# Altium footprint library lib_datalogger.PcbLib: 866 footprints (part 47 of 55)
Each footprint in its own frame and in the unit in brackets; x right, y up, seen from the top. Pads: shape width x height; smd on the part's side, far side on the other; paste and mask are expansions set on the pad; w line width, h text height; cw(c..) or ccw(c..) is an arc to the next point about the centre after c.
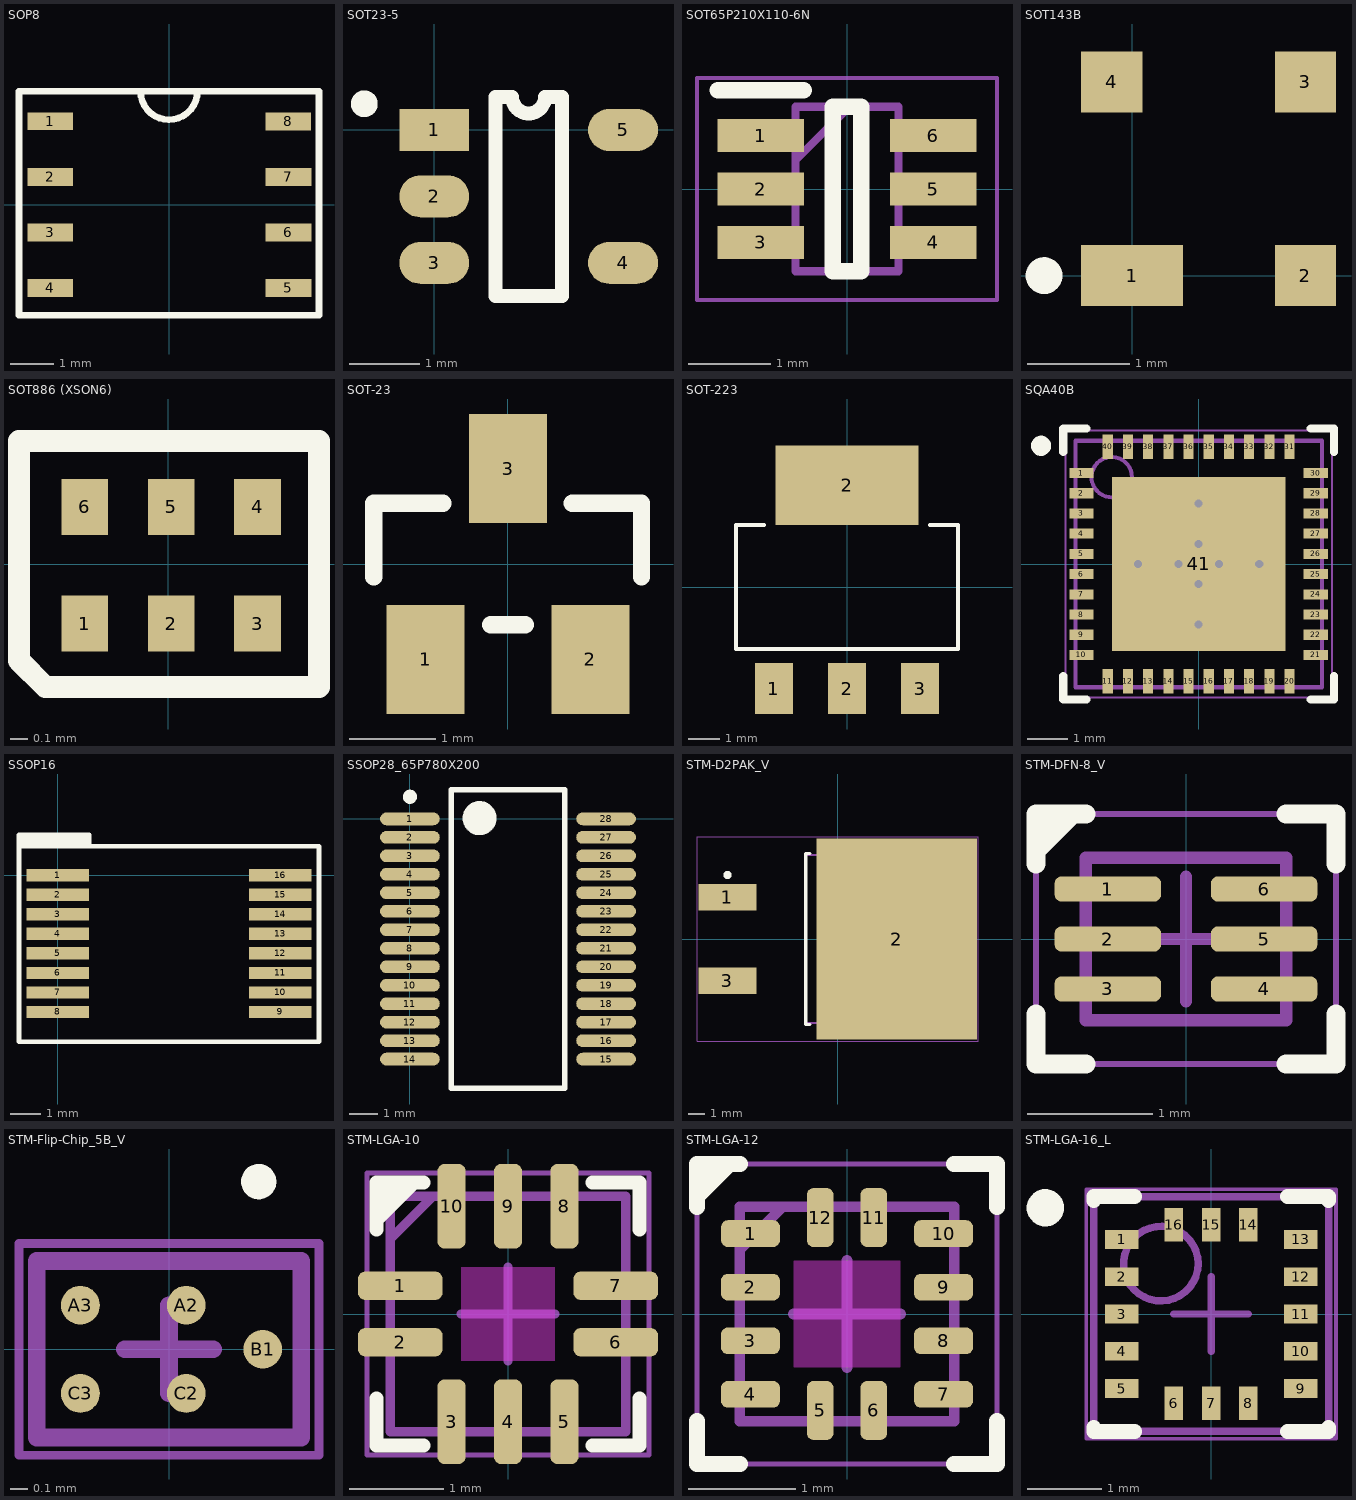
[diagram p46: the footprints below, top view; thin cyan lines are the x and y axes]

## SOP8 [mm]
pads (8):
  rect 1.045x0.41 smd: 1(-2.717,1.906) 2(-2.717,0.636) 3(-2.717,-0.634) 4(-2.717,-1.904) 5(2.725,-1.904) 6(2.725,-0.634) 7(2.725,0.636) 8(2.718,1.905)
Top Overlay:
  lines w0.152: -0.655,2.592 ccw(c-0.005,2.592) 0.645,2.584 ; -3.434,-2.526 3.424,-2.526 3.424,2.592 -3.434,2.592 -3.434,0.077 -3.434,-2.526
3D body "70521819.step": height 1.6, standoff -0.01, extent -3.118,-2.486 3.082,2.514

## SOT23-5 [mm]
pads (5):
  rect 1x0.6 smd: 1(0,0)
  oval 1x0.6 smd: 2(0,-0.95) 3(0,-1.9) 4(2.7,-1.9) 5(2.7,0)
Top Overlay:
  circle w0.203: c-1,0.375 r0.09
  lines w0.2: 0.875,-2.375 0.875,0.475 1.112,0.475 ccw(c1.35,0.475) 1.587,0.475 1.825,0.475 1.825,-2.375 0.875,-2.375
3D body "User Library-SOT-23-5.STEP": height 1.45, standoff -0.01, extent -0.15,-2.45 2.85,0.55

## SOT65P210X110-6N [mm]
pads (6):
  rect 1.05x0.4 smd: 1(-1.05,0.65) 2(-1.05,0) 3(-1.05,-0.65) 4(1.05,-0.65) 5(1.05,0) 6(1.05,0.65)
Top Overlay:
  lines w0.2: -1.575,1.2 -0.525,1.2 ; -0.175,-1 -0.175,1 0.175,1 0.175,-1 -0.175,-1
Mechanical 13:
  lines w0.1: -0.625,0.35 0.025,1 ; -0.625,-1 -0.625,1 0.625,1 0.625,-1 -0.625,-1
Mechanical 15:
  lines w0.05: -1.825,-1.35 -1.825,1.35 1.825,1.35 1.825,-1.35 -1.825,-1.35
3D body "PE4259.stp": height 1.1, standoff 0, extent -1.05,-1 1.05,1

## SOT143B [mm]
pads (4):
  rect 1x0.6 smd: 1(0,0)
  rect 0.6x0.6 smd: 2(1.7,0) 3(1.7,1.9) 4(-0.2,1.9)
Top Overlay:
  circle w0.203: c-0.864,0 r0.079
3D body "SOT143-1.step": height 1.22, standoff 0, extent -0.7,-0.232 2.2,2.132

## SOT886 (XSON6) [mm]
pads (6):
  rect 0.27x0.325 smd: 1(-0.483,-0.345) 2(0.017,-0.345) 3(0.517,-0.345) 4(0.517,0.33) 5(0.017,0.33) 6(-0.483,0.33)
Top Overlay:
  lines w0.127: -0.864,-0.559 -0.864,0.711 0.873,0.711 0.873,-0.711 -0.711,-0.711 -0.864,-0.559
3D body "SOT886 (XSON6).step": height 0.46, standoff -0.04, extent -0.733,-0.525 0.767,0.525

## SOT-23 [mm]
pads (3):
  rect 0.9x1.26 smd: 1(-0.95,-1.1) 2(0.95,-1.1) 3(0,1.1)
Top Overlay:
  lines w0.2: -1.55,-0.15 -1.55,0.7 -0.75,0.7 ; -0.2,-0.7 0.2,-0.7 ; 0.74,0.7 1.54,0.7 1.54,-0.15
3D body "User Library-SOT95P240X110-3M[SOT23-3_TO-236AB].step": height 1.09, standoff 0, extent -1.5,-1.25 1.5,1.25

## SOT-223 [mm]
pads (4):
  rect 1.2x1.6 smd: 1(-2.3,-3.2) 2(0,-3.2) 3(2.3,-3.2)
  rect 4.5x2.5 smd: 2(0,3.2)
Top Overlay:
  lines w0.127: -2.61,1.95 -3.5,1.95 -3.5,-1.95 3.5,-1.95 3.5,1.95 2.61,1.95
3D body "User Library-SOT-223-2.STEP": height 1.9, standoff 0, extent -3.35,-3.602 3.35,3.602

## SQA40B [mm] "QFN, 40-Leads, Body 6x6mm, Pitch 0.5mm, NSC Recommended"
height 0.8
pads (41):
  rect 0.6x0.25 smd paste-0.125 mask+0.051: 1(-2.9,2.25) 2(-2.9,1.75) 3(-2.9,1.25) 4(-2.9,0.75) 5(-2.9,0.25) 6(-2.9,-0.25) 7(-2.9,-0.75) 8(-2.9,-1.25) 9(-2.9,-1.75) 10(-2.9,-2.25) 21(2.9,-2.25) 22(2.9,-1.75) 23(2.9,-1.25) 24(2.9,-0.75) 25(2.9,-0.25) 26(2.9,0.25) 27(2.9,0.75) 28(2.9,1.25) 29(2.9,1.75) 30(2.9,2.25)
  rect 0.25x0.6 smd paste-0.125 mask+0.051: 11(-2.25,-2.9) 12(-1.75,-2.9) 13(-1.25,-2.9) 14(-0.75,-2.9) 15(-0.25,-2.9) 16(0.25,-2.9) 17(0.75,-2.9) 18(1.25,-2.9) 19(1.75,-2.9) 20(2.25,-2.9) 31(2.25,2.9) 32(1.75,2.9) 33(1.25,2.9) 34(0.75,2.9) 35(0.25,2.9) 36(-0.25,2.9) 37(-0.75,2.9) 38(-1.25,2.9) 39(-1.75,2.9) 40(-2.25,2.9)
  rect 4.3x4.3 smd paste-2.15 mask+0.051: 41(0,0)
via 0,0.5 diameter 0.5 hole 0.2
via 0,-0.5 diameter 0.5 hole 0.2
via 0.5,0 diameter 0.5 hole 0.2
via -0.5,0 diameter 0.5 hole 0.2
via 1.5,0 diameter 0.5 hole 0.2
via 0,1.5 diameter 0.5 hole 0.2
via 0,-1.5 diameter 0.5 hole 0.2
via -1.5,0 diameter 0.5 hole 0.2
Top Overlay:
  circle w0.25: c-3.9,2.925 r0.125
  lines w0.2: -3.35,-2.775 -3.35,-3.35 -2.775,-3.35 ; -3.35,2.775 -3.35,3.35 -2.775,3.35 ; 2.775,-3.35 3.35,-3.35 3.35,-2.775 ; 2.775,3.35 3.35,3.35 3.35,2.775
Top Paste:
  rectangle: 0.1,-2 2,-0.1
  region: -0.1,-0.1 -2,-0.1 -2,-2 -0.1,-2
  region: -0.1,2 -2,2 -2,0.1 -0.1,0.1
  rectangle: 0.1,0.1 2,2
  region: 2.125,3.4 2.125,2.7 2.375,2.7 2.375,3.4
  region: 1.625,3.4 1.625,2.7 1.875,2.7 1.875,3.4
  region: 1.125,3.4 1.125,2.7 1.375,2.7 1.375,3.4
  region: 0.625,3.4 0.625,2.7 0.875,2.7 0.875,3.4
  region: 0.125,3.4 0.125,2.7 0.375,2.7 0.375,3.4
  region: -0.375,3.4 -0.375,2.7 -0.125,2.7 -0.125,3.4
  region: -0.875,3.4 -0.875,2.7 -0.625,2.7 -0.625,3.4
  region: -1.375,3.4 -1.375,2.7 -1.125,2.7 -1.125,3.4
  region: -1.875,3.4 -1.875,2.7 -1.625,2.7 -1.625,3.4
  region: -2.375,3.4 -2.375,2.7 -2.125,2.7 -2.125,3.4
  region: 3.4,-2.125 2.7,-2.125 2.7,-2.375 3.4,-2.375
  region: 3.4,-1.625 2.7,-1.625 2.7,-1.875 3.4,-1.875
  region: 3.4,-1.125 2.7,-1.125 2.7,-1.375 3.4,-1.375
  region: 3.4,-0.625 2.7,-0.625 2.7,-0.875 3.4,-0.875
  region: 3.4,-0.125 2.7,-0.125 2.7,-0.375 3.4,-0.375
  region: 3.4,0.375 2.7,0.375 2.7,0.125 3.4,0.125
  region: 3.4,0.875 2.7,0.875 2.7,0.625 3.4,0.625
  region: 3.4,1.375 2.7,1.375 2.7,1.125 3.4,1.125
  region: 3.4,1.875 2.7,1.875 2.7,1.625 3.4,1.625
  region: 3.4,2.375 2.7,2.375 2.7,2.125 3.4,2.125
  region: -2.125,-3.4 -2.125,-2.7 -2.375,-2.7 -2.375,-3.4
  region: -1.625,-3.4 -1.625,-2.7 -1.875,-2.7 -1.875,-3.4
  region: -1.125,-3.4 -1.125,-2.7 -1.375,-2.7 -1.375,-3.4
  region: -0.625,-3.4 -0.625,-2.7 -0.875,-2.7 -0.875,-3.4
  region: -0.125,-3.4 -0.125,-2.7 -0.375,-2.7 -0.375,-3.4
  region: 0.375,-3.4 0.375,-2.7 0.125,-2.7 0.125,-3.4
  region: 0.875,-3.4 0.875,-2.7 0.625,-2.7 0.625,-3.4
  region: 1.375,-3.4 1.375,-2.7 1.125,-2.7 1.125,-3.4
  region: 1.875,-3.4 1.875,-2.7 1.625,-2.7 1.625,-3.4
  region: 2.375,-3.4 2.375,-2.7 2.125,-2.7 2.125,-3.4
  rectangle: -3.4,-2.375 -2.7,-2.125
  rectangle: -3.4,-1.875 -2.7,-1.625
  rectangle: -3.4,-1.375 -2.7,-1.125
  rectangle: -3.4,-0.875 -2.7,-0.625
  rectangle: -3.4,-0.375 -2.7,-0.125
  rectangle: -3.4,0.125 -2.7,0.375
  rectangle: -3.4,0.625 -2.7,0.875
  rectangle: -3.4,1.125 -2.7,1.375
  rectangle: -3.4,1.625 -2.7,1.875
  rectangle: -3.4,2.125 -2.7,2.375
Mechanical 13:
  circle w0.1: c-2.15,2.15 r0.5
  lines w0.1: -3.05,-3.05 3.05,-3.05 3.05,3.05 -3.05,3.05 -3.05,-3.05
Mechanical 15:
  lines w0.05: -3.3,-3.3 3.3,-3.3 3.3,3.3 -3.3,3.3 -3.3,-3.3
  lines w0.1: -0.5,0 0.5,0 ; 0,-0.5 0,0.5
3D body "User Library-DP83848K.step": height 0.8, standoff 0, extent -3.001,-3.001 3.001,3.001

## SSOP16 [mil]
pads (16):
  rect 82x16 smd: 1(0,0) 2(0,-25.59) 3(0,-51.18) 4(0,-76.77) 5(0,-102.36) 6(0,-127.95) 7(0,-153.54) 8(0,-179.13) 9(291,-179.13) 10(291,-153.54) 11(291,-127.95) 12(291,-102.36) 13(291,-76.77) 14(291,-51.18) 15(291,-25.59) 16(291,0)
Top Overlay:
  region: 41,38 41,53 -51,53 -51,38
  lines w6: 41,38 41,53 -51,53 -51,38 ; -51,38 -51,-218 342,-218 342,38 -51,38
3D body "SSOP16.step": height 78.31, standoff 0.31, extent -10,-214.48 301,34.48

## SSOP28_65P780X200 [mm] "SOP, 28-Leads, Body 10,5x5,6mm (max), Pitch 0,65mm, IPC Medium Density"
height 2
pads (28):
  oval 2.1x0.45 smd: 1(0,0) 2(0,-0.65) 3(0,-1.3) 4(0,-1.95) 5(0,-2.6) 6(0,-3.25) 7(0,-3.9) 8(0,-4.55) 9(0,-5.2) 10(0,-5.85) 11(0,-6.5) 12(0,-7.15) 13(0,-7.8) 14(0,-8.45) 15(6.9,-8.45) 16(6.9,-7.8) 17(6.9,-7.15) 18(6.9,-6.5) 19(6.9,-5.85) 20(6.9,-5.2) 21(6.9,-4.55) 22(6.9,-3.9) 23(6.9,-3.25) 24(6.9,-2.6) 25(6.9,-1.95) 26(6.9,-1.3) 27(6.9,-0.65) 28(6.9,0)
Top Overlay:
  circle w0.25: c0,0.775 r0.125
  circle w0.6: c2.45,0.025 r0.3
  lines w0.2: 1.45,-9.475 1.45,1.025 5.45,1.025 5.45,-9.475 1.45,-9.475
3D body "User Library-SSOP-28-FT232RL.step": height 2.16, standoff 0, extent -0.428,-9.398 7.328,0.932

## STM-D2PAK_V [mm] "DPAK, 3-Leads, Body 10.2x9.15mm, Pitch 2.54mm"
height 4.6
pads (3):
  rect 3.5x1.6 smd: 1(-6.7,2.54) 3(-6.7,-2.54)
  rect 9.75x12.2 smd: 2(3.575,0)
Top Overlay:
  circle w0.25: c-6.7,3.89 r0.125
  lines w0.2: -1.7,-5.2 -1.95,-5.2 -1.95,5.2 -1.7,5.2
Mechanical 13:
  lines w0.1: -1.95,-5.1 7.2,-5.1 7.2,5.1 -1.95,5.1 -1.95,-5.1
Mechanical 15:
  lines w0.05: -8.55,-6.2 8.55,-6.2 8.55,6.2 -8.55,6.2 -8.55,-6.2
  lines w0.1: -0.5,0 0.5,0 ; 0,-0.5 0,0.5
3D body: height 4.6, standoff 0.03, extent -1.95,-5.1 7.2,5.1

## STM-DFN-8_V [mm] "DFN, 8-Leads, Body 2x2mm, Pitch 0.5mm"
height 0.6
pads (6):
  rrect50% 0.85x0.2 smd: 1(-0.625,0.4) 2(-0.625,0) 3(-0.625,-0.4) 4(0.625,-0.4) 5(0.625,0) 6(0.625,0.4)
Top Overlay:
  region: -1.2,1 -1.2,0.7 -0.9,1
  lines w0.15: -1.2,-0.6 -1.2,-1 -0.8,-1 ; -1.2,0.6 -1.2,1 -0.8,1 ; -1.2,0.7 -0.9,1 ; 0.8,-1 1.2,-1 1.2,-0.6 ; 0.8,1 1.2,1 1.2,0.6
Mechanical 13:
  lines w0.1: -0.8,-0.65 -0.8,0.65 0.8,0.65 0.8,-0.65 -0.8,-0.65
Mechanical 15:
  lines w0.05: -1.2,-1 -1.2,1 1.2,1 1.2,-1 -1.2,-1
  lines w0.1: -0.5,0 0.5,0 ; 0,-0.5 0,0.5
Top Designator:
  text ".Designator" at -1.27,-0.127 h0.6
3D body "DFN-6-1.6x1.3.STEP": height 0.56, standoff -0.01, extent -0.81,-0.65 0.81,0.65

## STM-Flip-Chip_5B_V [mm] "BGA, 5-Balls, Body 1.5x1mm"
height 0.69
pads (5):
  round 0.22 smd paste-2 mask+0.05: A2(0.098,0.25) A3(-0.502,0.25) B1(0.531,0) C2(0.098,-0.25) C3(-0.502,-0.25)
Top Overlay:
  circle w0.1: c0.508,0.95 r0.05
Top Paste:
  rectangle: -0.612,0.14 -0.392,0.36
  rectangle: -0.612,-0.36 -0.392,-0.14
  rectangle: -0.012,-0.36 0.208,-0.14
  rectangle: -0.012,0.14 0.208,0.36
  rectangle: 0.421,-0.11 0.641,0.11
Mechanical 13:
  lines w0.1: -0.75,-0.5 -0.75,0.5 0.75,0.5 0.75,-0.5 -0.75,-0.5
Mechanical 15:
  lines w0.05: -0.85,-0.6 0.85,-0.6 0.85,0.6 -0.85,0.6 -0.85,-0.6
  lines w0.1: -0.25,0 0.25,0 ; 0,-0.25 0,0.25
3D body: height 0.69, standoff 0.21, extent -0.75,-0.5 0.75,0.5
3D body: height 0.22, standoff 0, extent -0.618,0.144 -0.398,0.364
3D body: height 0.22, standoff 0, extent -0.618,-0.356 -0.398,-0.136
3D body: height 0.22, standoff 0, extent -0.018,-0.356 0.202,-0.136
3D body: height 0.22, standoff 0, extent -0.018,0.144 0.202,0.364
3D body: height 0.22, standoff 0, extent 0.415,-0.106 0.635,0.114

## STM-LGA-10 [mm] "LGA, 10-Leads, Body 2.5x2.5mm, Pitch 0.6mm"
height 0.8
pads (10):
  rrect50% 0.9x0.3 smd: 1(-1.145,0.3) 2(-1.145,-0.3) 6(1.145,-0.3) 7(1.145,0.3)
  rrect50% 0.3x0.9 smd: 3(-0.6,-1.145) 4(0,-1.145) 5(0.6,-1.145) 8(0.6,1.145) 9(0,1.145) 10(-0.6,1.145)
Top Layer keep-out:
  rectangle: -0.5,-0.5 0.5,0.5
Top Overlay:
  region: -1.4,1.4 -1.4,1 -1,1.4
  lines w0.15: -1.4,-0.9 -1.4,-1.4 -0.9,-1.4 ; -1.4,0.9 -1.4,1.4 -0.9,1.4 ; -1.4,1 -1,1.4 ; 0.9,-1.4 1.4,-1.4 1.4,-0.9 ; 0.9,1.4 1.4,1.4 1.4,0.9
Mechanical 13:
  lines w0.1: -0.8,1.25 -1.25,0.8 ; -1.25,0.8 -1.25,0.8 ; -1.25,-1.25 -1.25,1.25 1.25,1.25 1.25,-1.25 -1.25,-1.25
Mechanical 15:
  lines w0.05: -1.5,-1.5 -1.5,1.5 1.5,1.5 1.5,-1.5 -1.5,-1.5
  lines w0.1: -0.5,0 0.5,0 ; 0,-0.5 0,0.5
Top Designator:
  text ".Designator" at -1.27,-0.127 h0.6
3D body "HLGA-10L-2.5x2.5x0.8.STEP": height 0.8, standoff -0.04, extent -1.25,-1.25 1.25,1.25

## STM-LGA-12 [mm] "LGA, 12-Leads, Body 2x2mm, Pitch 0.5mm"
height 1
pads (12):
  rrect50% 0.55x0.25 smd: 1(-0.901,0.75) 2(-0.901,0.25) 3(-0.901,-0.25) 4(-0.901,-0.75) 7(0.901,-0.75) 8(0.901,-0.25) 9(0.901,0.25) 10(0.901,0.75)
  rrect50% 0.25x0.55 smd: 5(-0.25,-0.9) 6(0.25,-0.9) 11(0.25,0.9) 12(-0.25,0.9)
Top Overlay:
  region: -1.4,1.4 -1.4,1.1 -1.1,1.4
  lines w0.15: -1.4,-1 -1.4,-1.4 -1,-1.4 ; -1.4,1 -1.4,1.4 -1,1.4 ; -1.4,1.1 -1.1,1.4 ; 1,-1.4 1.4,-1.4 1.4,-1 ; 1,1.4 1.4,1.4 1.4,1
Keep-Out Layer:
  rectangle: -0.5,-0.5 0.5,0.5
Mechanical 13:
  lines w0.1: -1,0.6 -0.6,1 ; -1,-1 -1,1 1,1 1,-1 -1,-1
Mechanical 15:
  lines w0.05: -1.4,-1.4 -1.4,1.4 1.4,1.4 1.4,-1.4 -1.4,-1.4
  lines w0.1: -0.5,0 0.5,0 ; 0,-0.5 0,0.5
Top Designator:
  text ".Designator" at -1.27,-0.127 h0.6
3D body "LGA-2x2x0_9.STEP": height 0.95, standoff 0, extent -1,-1 1,1

## STM-LGA-16_L [mm] "LGA, 16-Leads, Body 3.15x3.15mm, Pitch 0.5mm, IPC High Density"
height 1
pads (16):
  rect 0.45x0.25 smd: 1(-1.2,1) 2(-1.2,0.5) 3(-1.2,0) 4(-1.2,-0.5) 5(-1.2,-1) 9(1.2,-1) 10(1.2,-0.5) 11(1.2,0) 12(1.2,0.5) 13(1.2,1)
  rect 0.25x0.45 smd: 6(-0.5,-1.2) 7(0,-1.2) 8(0.5,-1.2) 14(0.5,1.2) 15(0,1.2) 16(-0.5,1.2)
Top Overlay:
  circle w0.25: c-2.225,1.425 r0.125
  lines w0.2: -1.575,-1.525 -1.575,-1.575 -1.025,-1.575 ; -1.575,1.525 -1.575,1.575 -1.025,1.575 ; 1.025,-1.575 1.575,-1.575 1.575,-1.525 ; 1.025,1.575 1.575,1.575 1.575,1.525
Mechanical 13:
  circle w0.1: c-0.675,0.675 r0.5
  lines w0.1: -1.575,-1.575 -1.575,1.575 1.575,1.575 1.575,-1.575 -1.575,-1.575
Mechanical 15:
  lines w0.05: -1.675,-1.675 -1.675,1.675 1.675,1.675 1.675,-1.675 -1.675,-1.675
  lines w0.1: -0.5,0 0.5,0 ; 0,-0.5 0,0.5
3D body: height 1, standoff 0, extent -1.575,-1.575 1.575,1.575